# Altium footprint library ICs And Semiconductors SMD.PcbLib: 602 footprints (part 34 of 38) (continued)
## TEXAS_EUY (R-PDSS-B7) [mm] "TEXAS EUY (R-PDSS-B7)  Case"
height 9
pads (7):
  round 2.16 smd: 1(-11.115,6.35) 2(-11.115,-6.35) 3(-1.595,-6.35) 4(1.585,-6.35) 5(4.765,-6.35) 6(11.115,-6.35) 7(11.115,6.35)
Top Overlay:
  lines w0.2: -12.635,-7.875 12.635,-7.875 12.635,7.875 -12.635,7.875 -12.635,-7.875 ; -2.161,-3.965 -2.161,6.035 7.839,6.035 7.839,-3.965 -2.161,-3.965
Mechanical 8:
  lines w0.1: -12.115,-6.35 -11.115,-6.35 ; -12.115,6.35 -11.115,6.35 ; -11.115,-7.35 -11.115,-6.35 ; -11.115,-5.35 -11.115,-6.35 ; -11.115,5.35 -11.115,6.35 ; -11.115,7.35 -11.115,6.35 ; -10.115,-6.35 -11.115,-6.35 ; -10.115,6.35 -11.115,6.35 ; -2.595,-6.35 -1.595,-6.35 ; -1.595,-7.35 -1.595,-6.35 ; -1.595,-5.35 -1.595,-6.35 ; -1,0 0,0 ; -0.595,-6.35 -1.595,-6.35 ; 0,-1 0,0 ; 0,1 0,0 ; 0.585,-6.35 1.585,-6.35 ; 1,0 0,0 ; 1.585,-7.35 1.585,-6.35 ; 1.585,-5.35 1.585,-6.35 ; 2.585,-6.35 1.585,-6.35 ; 3.765,-6.35 4.765,-6.35 ; 4.765,-7.35 4.765,-6.35 ; 4.765,-5.35 4.765,-6.35 ; 5.765,-6.35 4.765,-6.35 ; 10.115,-6.35 11.115,-6.35 ; 10.115,6.35 11.115,6.35 ; 11.115,-7.35 11.115,-6.35 ; 11.115,-5.35 11.115,-6.35 ; 11.115,5.35 11.115,6.35 ; 11.115,7.35 11.115,6.35 ; 12.115,-6.35 11.115,-6.35 ; 12.115,6.35 11.115,6.35
Mechanical 14:
  circle w0.1: c-11.115,6.35 r0.89
  circle w0.1: c-11.115,-6.35 r0.89
  circle w0.1: c-1.595,-6.35 r0.89
  circle w0.1: c1.585,-6.35 r0.89
  circle w0.1: c4.765,-6.35 r0.89
  circle w0.1: c11.115,-6.35 r0.89
  circle w0.1: c11.115,6.35 r0.89
  lines w0.1: -12.635,-7.875 12.635,-7.875 12.635,7.875 -12.635,7.875 -12.635,-7.875 ; -2.161,-3.965 -2.161,6.035 7.839,6.035 7.839,-3.965 -2.161,-3.965
Mechanical 15:
  lines w0.05: -13.145,-8.38 13.145,-8.38 13.145,8.38 -13.145,8.38 -13.145,-8.38
3D body "TEXAS_EUY (R-PDSS-B7).stp": height 9.57, standoff 0, extent -12.635,-7.875 12.635,7.875

## TEXAS_PFM (NDY) [mm] "TEXAS PackagePFM (NDY), 1.27mm pitch; 15mm X 15mm X 6mm body"
height 6
pads (12):
  rect 2.41x0.86 smd: 1(-9.5,6.35) 2(-9.5,5.08) 3(-9.5,3.81) 4(-9.5,2.54) 5(-9.5,1.27) 6(-9.5,0) 7(-9.5,-1.27) 8(-9.5,-2.54) 9(-9.5,-3.81) 10(-9.5,-5.08) 11(-9.5,-6.35)
  rect 13.37x9.126 smd: 12(0,0)
Top Overlay:
  lines w0.2: -7.995,-6.68 -7.5,-6.68 ; -7.995,-6.02 -7.5,-6.02 ; -7.995,-5.41 -7.5,-5.41 ; -7.995,-4.75 -7.5,-4.75 ; -7.995,-4.14 -7.5,-4.14 ; -7.995,-3.48 -7.5,-3.48 ; -7.995,-2.87 -7.5,-2.87 ; -7.995,-2.21 -7.5,-2.21 ; -7.995,-1.6 -7.5,-1.6 ; -7.995,-0.94 -7.5,-0.94 ; -7.995,-0.33 -7.5,-0.33 ; -7.995,0.33 -7.5,0.33 ; -7.995,2.21 -7.5,2.21 ; -7.995,2.87 -7.5,2.87 ; -7.995,3.48 -7.5,3.48 ; -7.995,4.14 -7.5,4.14 ; -7.995,4.75 -7.5,4.75 ; -7.995,5.41 -7.5,5.41 ; -7.995,6.02 -7.5,6.02 ; -7.995,6.68 -7.5,6.68 ; -7.995,0.94 -7.5,0.94 -7.995,0.94 ; -7.995,1.6 -7.5,1.6 -7.995,1.6 ; -7.5,-7.5 -7.5,7.5 7.5,7.5 7.5,-7.5 -7.5,-7.5
Mechanical 8:
  lines w0.1: -10,-6.35 -9.5,-6.35 ; -10,-5.08 -9.5,-5.08 ; -10,-3.81 -9.5,-3.81 ; -10,-2.54 -9.5,-2.54 ; -10,-1.27 -9.5,-1.27 ; -10,0 -9.5,0 ; -10,1.27 -9.5,1.27 ; -10,2.54 -9.5,2.54 ; -10,3.81 -9.5,3.81 ; -10,5.08 -9.5,5.08 ; -10,6.35 -9.5,6.35 ; -9.5,-6.85 -9.5,-6.35 ; -9.5,-5.85 -9.5,-6.35 ; -9.5,-5.58 -9.5,-5.08 ; -9.5,-4.58 -9.5,-5.08 ; -9.5,-4.31 -9.5,-3.81 ; -9.5,-3.31 -9.5,-3.81 ; -9.5,-3.04 -9.5,-2.54 ; -9.5,-2.04 -9.5,-2.54 ; -9.5,-1.77 -9.5,-1.27 ; -9.5,-0.77 -9.5,-1.27 ; -9.5,-0.5 -9.5,0 ; -9.5,0.5 -9.5,0 ; -9.5,0.77 -9.5,1.27 ; -9.5,1.77 -9.5,1.27 ; -9.5,2.04 -9.5,2.54 ; -9.5,3.04 -9.5,2.54 ; -9.5,3.31 -9.5,3.81 ; -9.5,4.31 -9.5,3.81 ; -9.5,4.58 -9.5,5.08 ; -9.5,5.58 -9.5,5.08 ; -9.5,5.85 -9.5,6.35 ; -9.5,6.85 -9.5,6.35 ; -9,-6.35 -9.5,-6.35 ; -9,-5.08 -9.5,-5.08 ; -9,-3.81 -9.5,-3.81 ; -9,-2.54 -9.5,-2.54 ; -9,-1.27 -9.5,-1.27 ; -9,0 -9.5,0 ; -9,1.27 -9.5,1.27 ; -9,2.54 -9.5,2.54 ; -9,3.81 -9.5,3.81 ; -9,5.08 -9.5,5.08 ; -9,6.35 -9.5,6.35 ; -0.5,0 0,0 ; 0,-0.5 0,0 ; 0,0.5 0,0 ; 0.5,0 0,0 ; -10.705,-6.78 -8.295,-6.78 -8.295,-5.92 -10.705,-5.92 -10.705,-6.78 ; -10.705,-5.51 -8.295,-5.51 -8.295,-4.65 -10.705,-4.65 -10.705,-5.51 ; -10.705,-4.24 -8.295,-4.24 -8.295,-3.38 -10.705,-3.38 -10.705,-4.24 ; -10.705,-2.97 -8.295,-2.97 -8.295,-2.11 -10.705,-2.11 -10.705,-2.97 ; -10.705,-1.7 -8.295,-1.7 -8.295,-0.84 -10.705,-0.84 -10.705,-1.7 ; -10.705,-0.43 -8.295,-0.43 -8.295,0.43 -10.705,0.43 -10.705,-0.43 ; -10.705,0.84 -8.295,0.84 -8.295,1.7 -10.705,1.7 -10.705,0.84 ; -10.705,2.11 -8.295,2.11 -8.295,2.97 -10.705,2.97 -10.705,2.11 ; -10.705,3.38 -8.295,3.38 -8.295,4.24 -10.705,4.24 -10.705,3.38 ; -10.705,4.65 -8.295,4.65 -8.295,5.51 -10.705,5.51 -10.705,4.65 ; -10.705,5.92 -8.295,5.92 -8.295,6.78 -10.705,6.78 -10.705,5.92 ; -6.685,-4.563 -6.685,4.563 6.685,4.563 6.685,-4.563 -6.685,-4.563
Mechanical 14:
  lines w0.1: -7.5,-6.68 -10.28,-6.68 -10.28,-6.02 -7.5,-6.02 ; -7.5,-5.41 -10.28,-5.41 -10.28,-4.75 -7.5,-4.75 ; -7.5,-4.14 -10.28,-4.14 -10.28,-3.48 -7.5,-3.48 ; -7.5,-2.87 -10.28,-2.87 -10.28,-2.21 -7.5,-2.21 ; -7.5,-1.6 -10.28,-1.6 -10.28,-0.94 -7.5,-0.94 ; -7.5,-0.33 -10.28,-0.33 -10.28,0.33 -7.5,0.33 ; -7.5,0.94 -10.28,0.94 -10.28,1.6 -7.5,1.6 ; -7.5,2.21 -10.28,2.21 -10.28,2.87 -7.5,2.87 ; -7.5,3.48 -10.28,3.48 -10.28,4.14 -7.5,4.14 ; -7.5,4.75 -10.28,4.75 -10.28,5.41 -7.5,5.41 ; -7.5,6.02 -10.28,6.02 -10.28,6.68 -7.5,6.68 ; -7.5,-7.5 -7.5,7.5 7.5,7.5 7.5,-7.5 -7.5,-7.5
3D body "TEXAS_PFM (NDY).stp": height 6.11, standoff 0, extent -10.28,-7.5 7.5,7.5

## TEXAS_RGY (S-PVQFN–N14) [mm] "PSON, JEDEC MO-241BA, TEXAS RGY (S-PVQFN–N14), 0.50mm Pitch, Square; 5 Pin X 4 Pin, 3.5mm X 3.5mm X 1.00mm H body (w/thermal tab 2.05 X 2.05mm)"
height 1
pads (15):
  oval 0.3x0.85 smd: 1(-0.75,1.75) 7(-0.75,-1.75) 8(0.75,-1.75) 14(0.75,1.75)
  oval 0.85x0.3 smd: 2(-1.75,1) 3(-1.75,0.5) 4(-1.75,0) 5(-1.75,-0.5) 6(-1.75,-1) 9(1.75,-1) 10(1.75,-0.5) 11(1.75,0) 12(1.75,0.5) 13(1.75,1)
  rect 2.05x2.05 smd: 15(0,0)
Top Layer:
  region: -1.025,1.025 -0.375,1.025 -0.375,2.15 -0.175,2.15 -0.175,1.425 0.175,1.425 0.175,2.15 0.375,2.15 0.375,1.025 1.025,1.025 1.025,-1.025 0.375,-1.025 0.375,-2.15 0.175,-2.15 0.175,-1.425 -0.175,-1.425 -0.175,-2.15 -0.375,-2.15 -0.375,-1.025 -1.025,-1.025
Top Overlay:
  circle w0.25: c-0.75,2.8 r0.125
  lines w0.2: -1.75,-1.5 -1.75,-1.75 -1.25,-1.75 ; -1.75,1.5 -1.75,1.55 -1.55,1.75 -1.25,1.75 ; 1.25,-1.75 1.75,-1.75 1.75,-1.5 ; 1.25,1.75 1.75,1.75 1.75,1.5
Mechanical 8:
  lines w0.1: -1,0 0,0 ; 0,-1 0,0 ; 0,1 0,0 ; 1,0 0,0 ; -1.025,-1.025 -1.025,1.025 -0.375,1.025 -0.375,2.15 -0.175,2.15 -0.175,1.425 0.175,1.425 0.175,2.15 0.375,2.15 0.375,1.025 1.025,1.025 1.025,-1.025 0.375,-1.025 0.375,-2.15 0.175,-2.15 0.175,-1.425 -0.175,-1.425 -0.175,-2.15 -0.375,-2.15 -0.375,-1.025 -1.025,-1.025
Mechanical 14:
  lines w0.1: -1.75,0.75 -0.75,1.75 ; -1.75,0.85 -0.85,1.75 ; -1.75,0.95 -0.95,1.75 ; -1.75,1.05 -1.05,1.75 ; -1.75,1.15 -1.15,1.75 ; -1.75,1.25 -1.25,1.75 ; -1.75,1.35 -1.35,1.75 ; -1.75,1.45 -1.45,1.75 ; -1.75,1.55 -1.55,1.75 ; -1.75,1.65 -1.65,1.75 ; -1.75,-1.75 -1.75,1.75 1.75,1.75 1.75,-1.75 -1.75,-1.75
Mechanical 15:
  lines w0.05: -0.5,0 0.5,0 ; 0,-0.5 0,0.5 ; -2.45,-2.45 -2.45,2.45 2.45,2.45 2.45,-2.45 -2.45,-2.45
3D body "TEXAS_RGY (S-PVQFN–N14).stp": height 1, standoff 0, extent -1.825,-1.825 1.825,1.825

## TEXAS_RSL (S-PVQFN-N48) [mm] "TEXAS Case Style RSL, QFN, 0.40mm Pitch, Square; 48 Pin, 6.00mm L X 6.00mm W X 1.00mm H body (w/thermal tab 4.05 X 4.05mm)"
height 1
pads (51):
  oval 0.85x0.2 smd: 1(-2.975,2.2) 2(-2.975,1.8) 3(-2.975,1.4) 4(-2.975,1) 5(-2.975,0.6) 6(-2.975,0.2) 7(-2.975,-0.2) 8(-2.975,-0.6) 9(-2.975,-1) 10(-2.975,-1.4) 11(-2.975,-1.8) 12(-2.975,-2.2) 25(2.975,-2.2) 26(2.975,-1.8) 27(2.975,-1.4) 28(2.975,-1) 29(2.975,-0.6) 30(2.975,-0.2) 31(2.975,0.2) 32(2.975,0.6) 33(2.975,1) 34(2.975,1.4) 35(2.975,1.8) 36(2.975,2.2)
  oval 0.2x0.85 smd: 13(-2.2,-2.975) 14(-1.8,-2.975) 15(-1.4,-2.975) 16(-1,-2.975) 17(-0.6,-2.975) 18(-0.2,-2.975) 19(0.2,-2.975) 20(0.6,-2.975) 21(1,-2.975) 22(1.4,-2.975) 23(1.8,-2.975) 24(2.2,-2.975) 37(2.2,2.975) 38(1.8,2.975) 39(1.4,2.975) 40(1,2.975) 41(0.6,2.975) 42(0.2,2.975) 43(-0.2,2.975) 44(-0.6,2.975) 45(-1,2.975) 46(-1.4,2.975) 47(-1.8,2.975) 48(-2.2,2.975)
  rect 4.05x4.05 smd: 49(-0.225,0.225)
  round 1 smd paste-0.51 mask+0.5: FTG1(-3.85,-3.85) FTG2(3.85,3.85)
Top Layer keep-out:
  circle w0.1: c-3.85,-3.85 r1
  circle w0.1: c3.85,3.85 r1
Top Overlay:
  circle w0.25: c-4,2.2 r0.125
  lines w0.2: -3.075,-2.65 -3.075,-3.075 -2.65,-3.075 ; -3.075,2.65 -3.075,2.795 -2.795,3.075 -2.65,3.075 ; 2.65,-3.075 3.075,-3.075 3.075,-2.65 ; 2.65,3.075 3.075,3.075 3.075,2.65
Top Paste:
  region: 0.65,1.1 0.65,2.25 1.8,2.25 1.8,1.1
  region: 0.65,-0.35 0.65,0.8 1.8,0.8 1.8,-0.35
  region: 0.65,-1.8 0.65,-0.65 1.8,-0.65 1.8,-1.8
  region: -0.8,-1.8 -0.8,-0.65 0.35,-0.65 0.35,-1.8
  region: -2.25,-1.8 -2.25,-0.65 -1.1,-0.65 -1.1,-1.8
  region: -2.25,-0.35 -2.25,0.8 -1.1,0.8 -1.1,-0.35
  region: -0.8,-0.35 -0.8,0.8 0.35,0.8 0.35,-0.35
  region: -0.8,1.1 -0.8,2.25 0.35,2.25 0.35,1.1
  region: -2.25,1.1 -2.25,2.25 -1.1,2.25 -1.1,1.1
Mechanical 8:
  lines w0.1: -3.4,-2.2 -2.975,-2.2 ; -3.4,2.2 -2.975,2.2 ; -2.975,-1.8 -2.975,-2.2 ; -2.975,1.8 -2.975,2.2 ; -2.55,-2.2 -2.975,-2.2 ; -2.55,2.2 -2.975,2.2 ; -2.2,-3.4 -2.2,-2.975 ; -2.2,-2.55 -2.2,-2.975 ; -2.2,2.55 -2.2,2.975 ; -2.2,3.4 -2.2,2.975 ; -2.079,-1.629 -1.725,-1.275 ; -2.079,-0.921 -1.725,-1.275 ; -2.079,-0.629 -1.725,-0.275 ; -2.079,0.079 -1.725,-0.275 ; -2.079,0.371 -1.725,0.725 ; -2.079,1.079 -1.725,0.725 ; -2.079,1.371 -1.725,1.725 ; -2.079,2.079 -1.725,1.725 ; -1.8,-2.975 -2.2,-2.975 ; -1.8,2.975 -2.2,2.975 ; -1.371,-1.629 -1.725,-1.275 ; -1.371,-0.921 -1.725,-1.275 ; -1.371,-0.629 -1.725,-0.275 ; -1.371,0.079 -1.725,-0.275 ; -1.371,0.371 -1.725,0.725 ; -1.371,1.079 -1.725,0.725 ; -1.371,1.371 -1.725,1.725 ; -1.371,2.079 -1.725,1.725 ; -1.079,-1.629 -0.725,-1.275 ; -1.079,-0.921 -0.725,-1.275 ; -1.079,-0.629 -0.725,-0.275 ; -1.079,0.079 -0.725,-0.275 ; -1.079,0.371 -0.725,0.725 ; -1.079,1.079 -0.725,0.725 ; -1.079,1.371 -0.725,1.725 ; -1.079,2.079 -0.725,1.725 ; -0.725,0.225 -0.225,0.225 -0.225,0.725 ; -0.5,0 0,0 ; -0.371,-1.629 -0.725,-1.275 ; -0.371,-0.921 -0.725,-1.275 ; -0.371,-0.629 -0.725,-0.275 ; -0.371,1.079 -0.725,0.725 ; -0.371,1.371 -0.725,1.725 ; -0.371,2.079 -0.725,1.725 ; -0.079,-1.629 0.275,-1.275 ; -0.079,-0.921 0.275,-1.275 ; -0.079,-0.629 0.275,-0.275 ; -0.079,1.079 0.275,0.725 ; -0.079,1.371 0.275,1.725 ; -0.079,2.079 0.275,1.725 ; 0,-0.5 0,0 ; 0,0.5 0,0 ; 0.5,0 0,0 ; 0.629,-1.629 0.275,-1.275 ; 0.629,-0.921 0.275,-1.275 ; 0.629,-0.629 0.275,-0.275 ; 0.629,0.079 0.275,-0.275 ; 0.629,0.371 0.275,0.725 ; 0.629,1.079 0.275,0.725 ; 0.629,1.371 0.275,1.725 ; 0.629,2.079 0.275,1.725 ; 0.921,-1.629 1.275,-1.275 ; 0.921,-0.921 1.275,-1.275 ; 0.921,-0.629 1.275,-0.275 ; 0.921,0.079 1.275,-0.275 ; 0.921,0.371 1.275,0.725 ; 0.921,1.079 1.275,0.725 ; 0.921,1.371 1.275,1.725 ; 0.921,2.079 1.275,1.725 ; 1.629,-1.629 1.275,-1.275 ; 1.629,-0.921 1.275,-1.275 ; 1.629,-0.629 1.275,-0.275 ; 1.629,0.079 1.275,-0.275 ; 1.629,0.371 1.275,0.725 ; 1.629,1.079 1.275,0.725 ; 1.629,1.371 1.275,1.725 ; 1.629,2.079 1.275,1.725 ; 1.8,-2.975 2.2,-2.975 ; 1.8,2.975 2.2,2.975 ; 2.2,-3.4 2.2,-2.975 ; 2.2,-2.55 2.2,-2.975 ; 2.2,2.55 2.2,2.975 ; 2.2,3.4 2.2,2.975 ; 2.55,-2.2 2.975,-2.2 ; 2.55,2.2 2.975,2.2 ; 2.975,-1.8 2.975,-2.2 ; 2.975,1.8 2.975,2.2 ; 3.4,-2.2 2.975,-2.2 ; 3.4,2.2 2.975,2.2 ; -3.4,-2.3 -2.65,-2.3 ccw(c-2.65,-2.2) -2.65,-2.1 -3.4,-2.1 -3.4,-2.3 ; -3.4,2.1 -3.4,2.3 -2.65,2.3 cw(c-2.65,2.2) -2.65,2.1 -3.4,2.1 ; -2.3,-3.4 -2.1,-3.4 -2.1,-2.65 ccw(c-2.2,-2.65) -2.3,-2.65 -2.3,-3.4 ; -2.3,2.65 ccw(c-2.2,2.65) -2.1,2.65 -2.1,3.4 -2.3,3.4 -2.3,2.65 ; -2.25,-1.8 -2.25,2.25 1.8,2.25 1.8,-1.8 -2.25,-1.8 ; 2.1,-3.4 2.3,-3.4 2.3,-2.65 ccw(c2.2,-2.65) 2.1,-2.65 2.1,-3.4 ; 2.1,2.65 ccw(c2.2,2.65) 2.3,2.65 2.3,3.4 2.1,3.4 2.1,2.65 ; 2.65,-2.3 cw(c2.65,-2.2) 2.65,-2.1 3.4,-2.1 3.4,-2.3 2.65,-2.3 ; 2.65,2.1 cw(c2.65,2.2) 2.65,2.3 3.4,2.3 3.4,2.1 2.65,2.1
Mechanical 14:
  circle w0.1: c-2.25,2.25 r0.25
  lines w0.1: -3.075,-3.075 3.075,-3.075 3.075,3.075 -2.795,3.075 -3.075,2.795 -3.075,-3.075
Mechanical 15:
  lines w0.05: -3.65,-3.65 -3.65,3.65 3.65,3.65 3.65,-3.65 -3.65,-3.65
3D body "TEXAS_RSL (S-PVQFN-N48).stp": height 1, standoff 0, extent -3.075,-3.075 3.075,3.075

## TEXAS_RUQ (R-PB1QFN-N47) [mm] "TEXAS Case Style B1QFN, QFN, 0.90mm Pitch, Square; 47 Pin, 15.00mm L X 6mm W X 9mm H body (w/thermal tab 1.95 X 5.9mm + 2 x 4 X 2.1mm )"
height 2.9
pads (47):
  rect 0.6x0.6 smd paste-0.3 mask-0.3: 1(-4.1,6.95) 45(0,3.6)
  rect 0.95x0.6 smd: 2(-4.425,5.4) 3(-4.425,4.5) 4(-4.425,3.6) 5(-4.425,2.7) 6(-4.425,1.8) 7(-4.425,0.9) 8(-4.425,0) 9(-4.425,-0.9) 10(-4.425,-1.8) 11(-4.425,-2.7) 12(-4.425,-3.6) 13(-4.425,-4.5) 14(-4.425,-5.4) 24(4.425,-5.4) 25(4.425,-4.5) 26(4.425,-3.6) 27(4.425,-2.7) 28(4.425,-1.8) 29(4.425,-0.9) 30(4.425,0) 31(4.425,0.9) 32(4.425,1.8) 33(4.425,2.7) 34(4.425,3.6) 35(4.425,4.5) 36(4.425,5.4)
  rect 1.6x1.9 smd: 15(-4.1,-6.95) 23(4.1,-6.95) 37(4.1,6.95)
  rect 0.6x0.95 smd: 16(-2.7,-7.425) 17(-1.8,-7.425) 18(-0.9,-7.425) 19(0,-7.425) 20(0.9,-7.425) 21(1.8,-7.425) 22(2.7,-7.425) 38(2.7,7.425) 39(1.8,7.425) 40(0.9,7.425) 41(0,7.425) 42(-0.9,7.425) 43(-1.8,7.425) 44(-2.7,7.425)
  rect 2.2x4.1 smd: 46(-2.47,-3.38) 47(2.48,-3.38)
Top Layer:
  region: -4.9,6 -3.9,6 -3.3,6.6 -3.3,7.9 -4.9,7.9
  region: -3,3.3 -3,3.9 -1.025,3.9 -1.025,4.625 1.025,4.625 1.025,3.9 3,3.9 3,3.3 1.025,3.3 1.025,2.575 -1.025,2.575 -1.025,3.3
Top Overlay:
  lines w0.2: -5.4,-7.2 -5.4,-8.4 -4.2,-8.4 ; -5.4,7.2 -5.4,8.4 -4.2,8.4 ; -5.4,7.824 -4.824,8.4 ; -5.4,8.107 -5.107,8.4 ; 4.2,-8.4 5.4,-8.4 5.4,-7.2 ; 4.2,8.4 5.4,8.4 5.4,7.2
Mechanical 8:
  drawing of 349 lines, arcs and shapes, not listed
Mechanical 14:
  circle w0.1: c-3.5,6.5 r0.5
  lines w0.1: -4.5,-7.5 4.5,-7.5 4.5,7.474 -4.5,7.5 -4.5,-7.5
Mechanical 15:
  lines w0.1: -5.15,-8.15 5.15,-8.15 5.15,8.15 -5.15,8.15 -5.15,-8.15
3D body "TEXAS_RUQ (R-PB1QFN-N47).stp": height 2.9, standoff 0, extent -4.5,-7.5 4.5,7.5

## TEXAS_TO-PMOD (NDW) [mm] "TEXAS Package TO-PMOD (NDW), 1.27mm pitch; 9.85mm X 10.16mm X4.57m body"
height 4.57
pads (8):
  rect 3.06x0.89 smd: 1(-5.7,3.81) 2(-5.7,2.54) 3(-5.7,1.27) 4(-5.7,0) 5(-5.7,-1.27) 6(-5.7,-2.54) 7(-5.7,-3.81)
  rect 8.54x5.35 smd: 8(1.605,0)
Top Overlay:
  lines w0.2: -3.415,-4.16 -2.965,-4.16 ; -3.415,-3.46 -2.965,-3.46 ; -3.415,-2.89 -2.965,-2.89 ; -3.415,-2.19 -2.965,-2.19 ; -3.415,-1.62 -2.965,-1.62 ; -3.415,-0.92 -2.965,-0.92 ; -3.415,-0.35 -2.965,-0.35 ; -3.415,0.35 -2.965,0.35 ; -3.415,0.92 -2.965,0.92 ; -3.415,1.62 -2.965,1.62 ; -3.415,2.19 -2.965,2.19 ; -3.415,2.89 -2.965,2.89 ; -3.415,3.46 -2.965,3.46 ; -3.415,4.16 -2.965,4.16 ; -2.965,-5.08 -2.965,5.08 6.885,5.08 6.885,-5.08 -2.965,-5.08
Mechanical 8:
  lines w0.1: -6.2,-3.81 -5.7,-3.81 ; -6.2,-2.54 -5.7,-2.54 ; -6.2,-1.27 -5.7,-1.27 ; -6.2,0 -5.7,0 ; -6.2,1.27 -5.7,1.27 ; -6.2,2.54 -5.7,2.54 ; -6.2,3.81 -5.7,3.81 ; -5.7,-4.31 -5.7,-3.81 ; -5.7,-3.31 -5.7,-3.81 ; -5.7,-3.04 -5.7,-2.54 ; -5.7,-2.04 -5.7,-2.54 ; -5.7,-1.77 -5.7,-1.27 ; -5.7,-0.77 -5.7,-1.27 ; -5.7,-0.5 -5.7,0 ; -5.7,0.5 -5.7,0 ; -5.7,0.77 -5.7,1.27 ; -5.7,1.77 -5.7,1.27 ; -5.7,2.04 -5.7,2.54 ; -5.7,3.04 -5.7,2.54 ; -5.7,3.31 -5.7,3.81 ; -5.7,4.31 -5.7,3.81 ; -5.2,-3.81 -5.7,-3.81 ; -5.2,-2.54 -5.7,-2.54 ; -5.2,-1.27 -5.7,-1.27 ; -5.2,0 -5.7,0 ; -5.2,1.27 -5.7,1.27 ; -5.2,2.54 -5.7,2.54 ; -5.2,3.81 -5.7,3.81 ; -0.354,-0.354 0,0 ; -0.354,0.354 0,0 ; 0.354,-0.354 0,0 ; 0.354,0.354 0,0 ; 1.105,0 1.605,0 ; 1.605,-0.5 1.605,0 ; 1.605,0.5 1.605,0 ; 2.105,0 1.605,0 ; -7.23,-4.255 -7.23,-3.365 -4.17,-3.365 -4.17,-4.255 -7.23,-4.255 ; -7.23,-2.985 -7.23,-2.095 -4.17,-2.095 -4.17,-2.985 -7.23,-2.985 ; -7.23,-1.715 -7.23,-0.825 -4.17,-0.825 -4.17,-1.715 -7.23,-1.715 ; -7.23,-0.445 -7.23,0.445 -4.17,0.445 -4.17,-0.445 -7.23,-0.445 ; -7.23,0.825 -7.23,1.715 -4.17,1.715 -4.17,0.825 -7.23,0.825 ; -7.23,2.095 -7.23,2.985 -4.17,2.985 -4.17,2.095 -7.23,2.095 ; -7.23,3.365 -7.23,4.255 -4.17,4.255 -4.17,3.365 -7.23,3.365 ; -2.665,-2.675 -2.665,2.675 5.875,2.675 5.875,-2.675 -2.665,-2.675
Mechanical 14:
  lines w0.1: -2.965,-4.16 -6.885,-4.16 -6.885,-3.46 -2.965,-3.46 ; -2.965,-2.89 -6.885,-2.89 -6.885,-2.19 -2.965,-2.19 ; -2.965,-1.62 -6.885,-1.62 -6.885,-0.92 -2.965,-0.92 ; -2.965,-0.35 -6.885,-0.35 -6.885,0.35 -2.965,0.35 ; -2.965,0.92 -6.885,0.92 -6.885,1.62 -2.965,1.62 ; -2.965,2.19 -6.885,2.19 -6.885,2.89 -2.965,2.89 ; -2.965,3.46 -6.885,3.46 -6.885,4.16 -2.965,4.16 ; -2.965,-5.08 -2.965,5.08 6.885,5.08 6.885,-5.08 -2.965,-5.08
Mechanical 15:
  lines w0.05: -7.48,-5.33 -7.48,5.33 7.135,5.33 7.135,-5.33 -7.48,-5.33
3D body "TEXAS_TO-PMOD (NDW).stp": height 4.77, standoff 0, extent -6.885,-5.08 6.885,5.08

## TEXAS_TO-PMOD (NDW)_OLD [mm] "TEXAS Package TO-PMOD (NDW), 1.27mm pitch; 9.85mm X 10.16mm X4.57m body"
height 4.57
pads (8):
  rect 2.41x0.89 smd: 1(-5.339,3.81) 2(-5.339,2.54) 3(-5.339,1.27) 4(-5.339,0) 5(-5.339,-1.27) 6(-5.339,-2.54) 7(-5.339,-3.81)
  rect 8.54x5.35 smd: 8(2.291,0)
Top Overlay:
  lines w0.2: -3.734,-4.16 -2.279,-4.16 ; -3.734,-3.46 -2.279,-3.46 ; -3.734,-2.89 -2.279,-2.89 ; -3.734,-2.19 -2.279,-2.19 ; -3.734,-1.62 -2.279,-1.62 ; -3.734,-0.92 -2.279,-0.92 ; -3.734,-0.35 -2.279,-0.35 ; -3.734,0.35 -2.279,0.35 ; -3.734,0.92 -2.279,0.92 ; -3.734,1.62 -2.279,1.62 ; -3.734,2.19 -2.279,2.19 ; -3.734,2.89 -2.279,2.89 ; -3.734,3.46 -2.279,3.46 ; -3.734,4.16 -2.279,4.16 ; -2.279,-5.08 7.571,-5.08 7.571,5.08 -2.279,5.08 -2.279,-5.08
Mechanical 8:
  lines w0.1: -5.839,-3.81 -5.339,-3.81 ; -5.839,-2.54 -5.339,-2.54 ; -5.839,-1.27 -5.339,-1.27 ; -5.839,0 -5.339,0 ; -5.839,1.27 -5.339,1.27 ; -5.839,2.54 -5.339,2.54 ; -5.839,3.81 -5.339,3.81 ; -5.339,-4.31 -5.339,-3.81 ; -5.339,-3.31 -5.339,-3.81 ; -5.339,-3.04 -5.339,-2.54 ; -5.339,-2.04 -5.339,-2.54 ; -5.339,-1.77 -5.339,-1.27 ; -5.339,-0.77 -5.339,-1.27 ; -5.339,-0.5 -5.339,0 ; -5.339,0.5 -5.339,0 ; -5.339,0.77 -5.339,1.27 ; -5.339,1.77 -5.339,1.27 ; -5.339,2.04 -5.339,2.54 ; -5.339,3.04 -5.339,2.54 ; -5.339,3.31 -5.339,3.81 ; -5.339,4.31 -5.339,3.81 ; -4.839,-3.81 -5.339,-3.81 ; -4.839,-2.54 -5.339,-2.54 ; -4.839,-1.27 -5.339,-1.27 ; -4.839,0 -5.339,0 ; -4.839,1.27 -5.339,1.27 ; -4.839,2.54 -5.339,2.54 ; -4.839,3.81 -5.339,3.81 ; 1.791,0 2.291,0 ; 2.291,-0.5 2.291,0 ; 2.291,0.5 2.291,0 ; 2.791,0 2.291,0
Mechanical 14:
  lines w0.1: -2.279,-4.16 -6.199,-4.16 -6.199,-3.46 -2.279,-3.46 ; -2.279,-2.89 -6.199,-2.89 -6.199,-2.19 -2.279,-2.19 ; -2.279,-1.62 -6.199,-1.62 -6.199,-0.92 -2.279,-0.92 ; -2.279,-0.35 -6.199,-0.35 -6.199,0.35 -2.279,0.35 ; -2.279,0.92 -6.199,0.92 -6.199,1.62 -2.279,1.62 ; -2.279,2.19 -6.199,2.19 -6.199,2.89 -2.279,2.89 ; -2.279,3.46 -6.199,3.46 -6.199,4.16 -2.279,4.16 ; -2.279,-5.08 7.571,-5.08 7.571,5.08 -2.279,5.08 -2.279,-5.08
Mechanical 15:
  lines w0.05: -0.5,0 0,0 ; 0,-0.5 0,0 ; 0,0.5 0,0 ; 0.5,0 0,0 ; -7.044,-5.58 8.071,-5.58 8.071,5.58 -7.044,5.58 -7.044,-5.58
3D body "TEXAS_TO-PMOD (NDW).stp": height 4.77, standoff 0, extent -6.199,-5.08 7.571,5.08

## TEXAS_W (R-GDFP-F16) [mm] "TEXAS Case Style W(R-GDFP-F16), CFP, 1.27mm Pitch, Ceramic Dual FlatPacka 16 Pins, 6.73mm L X 10.16mm W X 2.03mm H body"
height 2.03
pads (16):
  rect 1.8x0.6 smd: 1(-4.97,4.445) 2(-4.97,3.175) 3(-4.97,1.905) 4(-4.97,0.635) 5(-4.97,-0.635) 6(-4.97,-1.905) 7(-4.97,-3.175) 8(-4.97,-4.445) 9(4.97,-4.445) 10(4.97,-3.175) 11(4.97,-1.905) 12(4.97,-0.635) 13(4.97,0.635) 14(4.97,1.905) 15(4.97,3.175) 16(4.97,4.445)
Keep-Out Layer:
  board cut-out: -3.25,-5.85 -3.369,-5.85 -3.59,-5.759 -3.759,-5.59 -3.85,-5.369 -3.85,-5.25 -3.85,5.25 -3.85,5.369 -3.759,5.59 -3.59,5.759 -3.369,5.85 -3.25,5.85 3.25,5.85 3.369,5.85 3.59,5.759 3.759,5.59 3.85,5.369 3.85,5.25 3.85,-5.25 3.85,-5.369 3.759,-5.59 3.59,-5.759 3.369,-5.85 3.25,-5.85
Mechanical 1:
  lines w0.635: -3.85,-5.25 ccw(c-3.25,-5.25) -3.25,-5.85 3.25,-5.85 ccw(c3.25,-5.25) 3.85,-5.25 3.85,5.25 ccw(c3.25,5.25) 3.25,5.85 -3.25,5.85 ccw(c-3.25,5.25) -3.85,5.25 -3.85,-5.25
Mechanical 8:
  lines w0.1: -5.47,-4.445 -4.97,-4.445 ; -5.47,-3.175 -4.97,-3.175 ; -5.47,-1.905 -4.97,-1.905 ; -5.47,-0.635 -4.97,-0.635 ; -5.47,0.635 -4.97,0.635 ; -5.47,1.905 -4.97,1.905 ; -5.47,3.175 -4.97,3.175 ; -5.47,4.445 -4.97,4.445 ; -4.97,-4.945 -4.97,-4.445 ; -4.97,-3.945 -4.97,-4.445 ; -4.97,-3.675 -4.97,-3.175 ; -4.97,-2.675 -4.97,-3.175 ; -4.97,-2.405 -4.97,-1.905 ; -4.97,-1.405 -4.97,-1.905 ; -4.97,-1.135 -4.97,-0.635 ; -4.97,-0.135 -4.97,-0.635 ; -4.97,0.135 -4.97,0.635 ; -4.97,1.135 -4.97,0.635 ; -4.97,1.405 -4.97,1.905 ; -4.97,2.405 -4.97,1.905 ; -4.97,2.675 -4.97,3.175 ; -4.97,3.675 -4.97,3.175 ; -4.97,3.945 -4.97,4.445 ; -4.97,4.945 -4.97,4.445 ; -4.47,-4.445 -4.97,-4.445 ; -4.47,-3.175 -4.97,-3.175 ; -4.47,-1.905 -4.97,-1.905 ; -4.47,-0.635 -4.97,-0.635 ; -4.47,0.635 -4.97,0.635 ; -4.47,1.905 -4.97,1.905 ; -4.47,3.175 -4.97,3.175 ; -4.47,4.445 -4.97,4.445 ; -0.5,0 0,0 ; 0,-0.5 0,0 ; 0,0.5 0,0 ; 0.5,0 0,0 ; 4.47,-4.445 4.97,-4.445 ; 4.47,-3.175 4.97,-3.175 ; 4.47,-1.905 4.97,-1.905 ; 4.47,-0.635 4.97,-0.635 ; 4.47,0.635 4.97,0.635 ; 4.47,1.905 4.97,1.905 ; 4.47,3.175 4.97,3.175 ; 4.47,4.445 4.97,4.445 ; 4.97,-4.945 4.97,-4.445 ; 4.97,-3.945 4.97,-4.445 ; 4.97,-3.675 4.97,-3.175 ; 4.97,-2.675 4.97,-3.175 ; 4.97,-2.405 4.97,-1.905 ; 4.97,-1.405 4.97,-1.905 ; 4.97,-1.135 4.97,-0.635 ; 4.97,-0.135 4.97,-0.635 ; 4.97,0.135 4.97,0.635 ; 4.97,1.135 4.97,0.635 ; 4.97,1.405 4.97,1.905 ; 4.97,2.405 4.97,1.905 ; 4.97,2.675 4.97,3.175 ; 4.97,3.675 4.97,3.175 ; 4.97,3.945 4.97,4.445 ; 4.97,4.945 4.97,4.445 ; 5.47,-4.445 4.97,-4.445 ; 5.47,-3.175 4.97,-3.175 ; 5.47,-1.905 4.97,-1.905 ; 5.47,-0.635 4.97,-0.635 ; 5.47,0.635 4.97,0.635 ; 5.47,1.905 4.97,1.905 ; 5.47,3.175 4.97,3.175 ; 5.47,4.445 4.97,4.445 ; -5.87,-4.745 -4.07,-4.745 -4.07,-4.145 -5.87,-4.145 -5.87,-4.745 ; -5.87,-3.475 -4.07,-3.475 -4.07,-2.875 -5.87,-2.875 -5.87,-3.475 ; -5.87,-2.205 -4.07,-2.205 -4.07,-1.605 -5.87,-1.605 -5.87,-2.205 ; -5.87,-0.935 -4.07,-0.935 -4.07,-0.335 -5.87,-0.335 -5.87,-0.935 ; -5.87,0.335 -4.07,0.335 -4.07,0.935 -5.87,0.935 -5.87,0.335 ; -5.87,1.605 -4.07,1.605 -4.07,2.205 -5.87,2.205 -5.87,1.605 ; -5.87,2.875 -4.07,2.875 -4.07,3.475 -5.87,3.475 -5.87,2.875 ; -5.87,4.145 -4.07,4.145 -4.07,4.745 -5.87,4.745 -5.87,4.145 ; 4.07,-4.745 5.87,-4.745 5.87,-4.145 4.07,-4.145 4.07,-4.745 ; 4.07,-3.475 5.87,-3.475 5.87,-2.875 4.07,-2.875 4.07,-3.475 ; 4.07,-2.205 5.87,-2.205 5.87,-1.605 4.07,-1.605 4.07,-2.205 ; 4.07,-0.935 5.87,-0.935 5.87,-0.335 4.07,-0.335 4.07,-0.935 ; 4.07,0.335 5.87,0.335 5.87,0.935 4.07,0.935 4.07,0.335 ; 4.07,1.605 5.87,1.605 5.87,2.205 4.07,2.205 4.07,1.605 ; 4.07,2.875 5.87,2.875 5.87,3.475 4.07,3.475 4.07,2.875 ; 4.07,4.145 5.87,4.145 5.87,4.745 4.07,4.745 4.07,4.145
Drill Drawing:
  lines w0.1: -2.91,1.658 -3.85,2 ; -2.91,2.342 -3.85,2 ; -1.942,-4.91 -1.6,-5.85 ; -1.942,4.91 -1.6,5.85 ; -1.258,-4.91 -1.6,-5.85 ; -1.258,4.91 -1.6,5.85 ; -0.511,-4.223 2.223,-4.223 3.674,-5.674 ; 2.768,-5.252 3.674,-5.674 ; 2.92,1.658 3.86,2 ; 2.92,2.342 3.86,2 ; 3.252,-4.768 3.674,-5.674 ; -3.85,2 3.86,2 ; -1.6,-5.85 -1.6,5.85 ; -3.85,-5.25 ccw(c-3.25,-5.25) -3.25,-5.85 3.25,-5.85 ccw(c3.25,-5.25) 3.85,-5.25 3.85,5.25 ccw(c3.25,5.25) 3.25,5.85 -3.25,5.85 ccw(c-3.25,5.25) -3.85,5.25 -3.85,-5.25
  text "11.7" at -1.809,-3.08 h1
  text "r0.6" at -0.267,-4.014 h1
  text "7.7" at 0.283,2.209 h1
3D body "TEXAS_W (R-GDFP-F16).stp": height 1.09, standoff -0.94, extent -5.32,-5.46 5.32,5.46